# Altium footprint library XU-GENARAL PCB .PcbLib: 1176 footprints (part 53 of 75)
Each footprint in its own frame and in the unit in brackets; x right, y up, seen from the top. Pads: shape width x height; smd on the part's side, far side on the other; paste and mask are expansions set on the pad; w line width, h text height; cw(c..) or ccw(c..) is an arc to the next point about the centre after c.
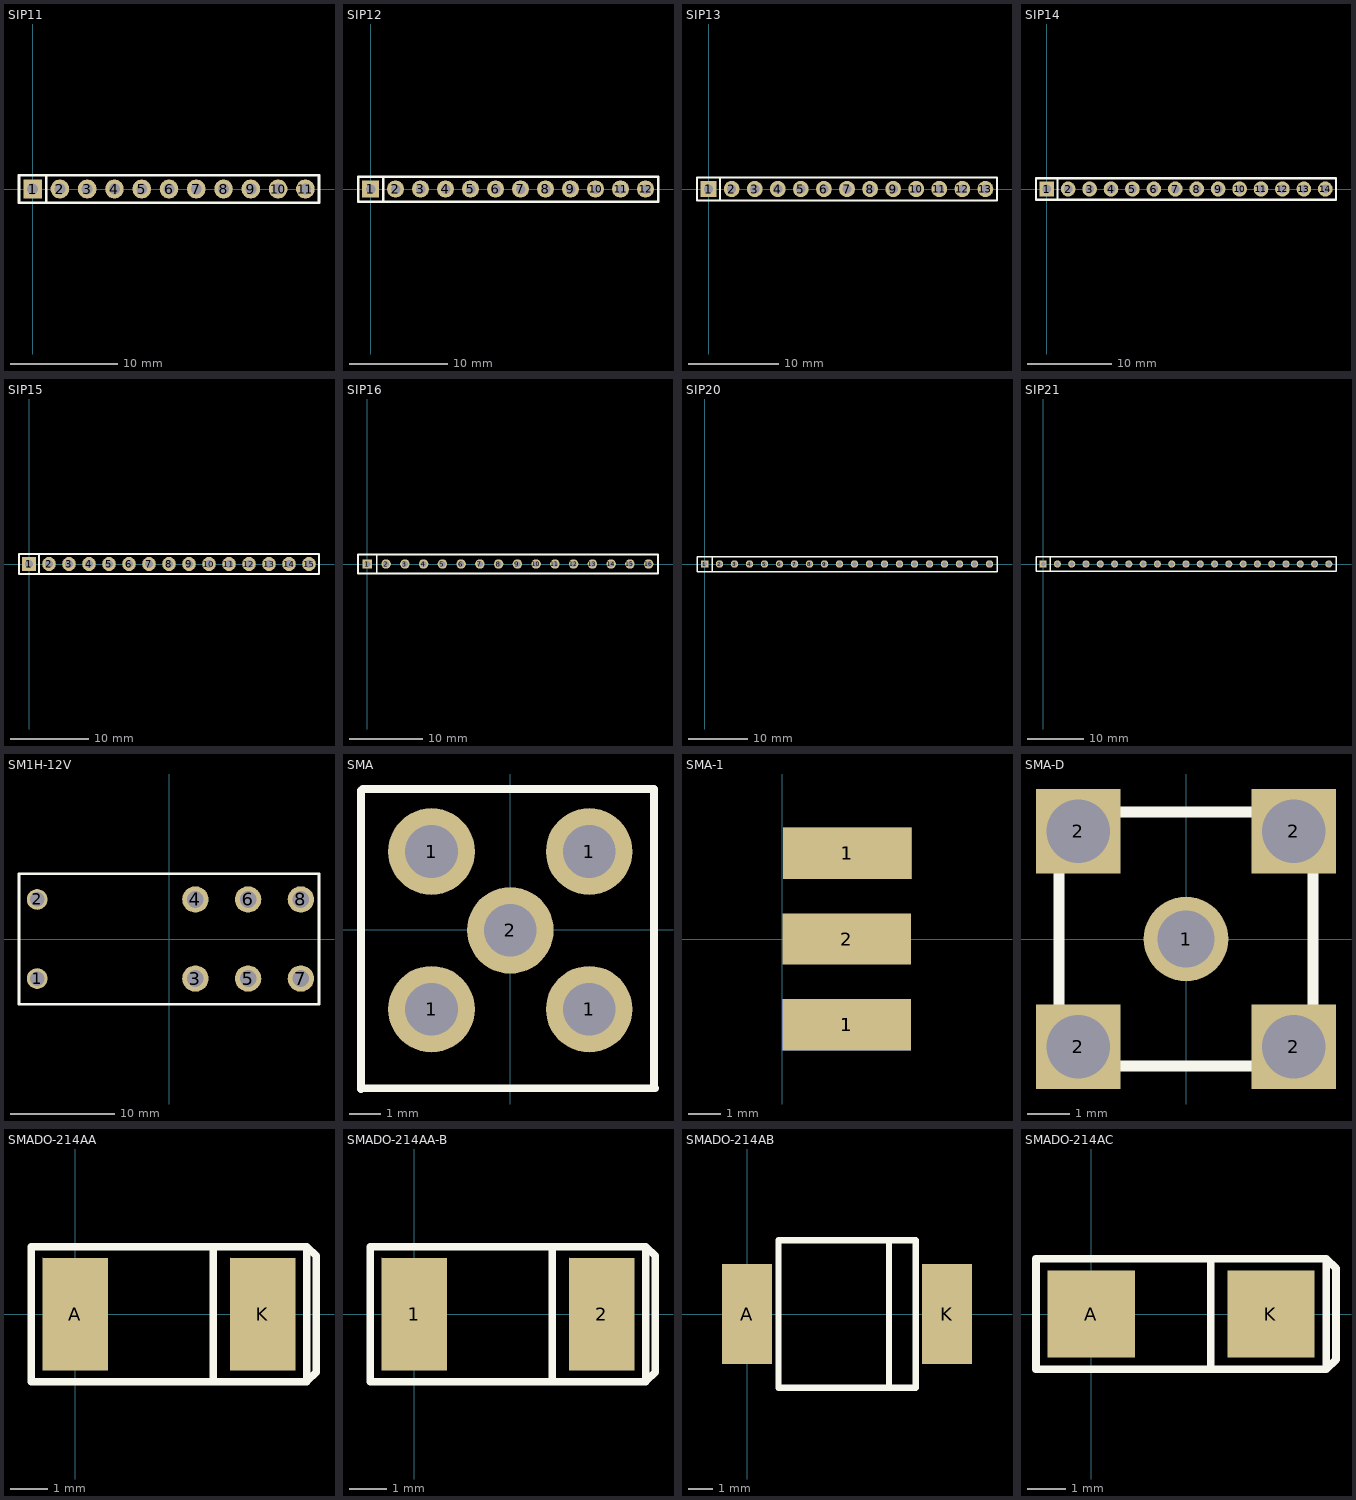
[diagram p52: the footprints below, top view; thin cyan lines are the x and y axes]

## SIP11 [mil]
pads (11):
  rect 68x70 hole 40: 1(0,0)
  oval 68x70 hole 40: 2(100,0) 3(200,0) 4(300,0) 5(400,0) 6(500,0) 7(600,0) 8(700,0) 9(800,0) 10(900,0) 11(1000,0)
Top Overlay:
  lines w10: 50,-50 50,50 ; -50,-50 1050,-50 1050,50 -50,50 -50,-50

## SIP12 [mil]
pads (12):
  rect 68x68 hole 38: 1(0,0)
  round 68 hole 38: 2(100,0) 3(200,0) 4(300,0) 5(400,0) 6(500,0) 7(600,0) 8(700,0) 9(800,0) 10(900,0) 11(1000,0) 12(1100,0)
Top Overlay:
  lines w10: 50,-50 50,50 ; -50,-50 1150,-50 1150,50 -50,50 -50,-50

## SIP13 [mil]
pads (13):
  rect 68x70 hole 40: 1(0,0)
  oval 68x70 hole 40: 2(100,0) 3(200,0) 4(300,0) 5(400,0) 6(500,0) 7(600,0) 8(700,0) 9(800,0) 10(900,0) 11(1000,0) 12(1100,0) 13(1200,0)
Top Overlay:
  lines w10: 50,-50 50,50 ; -50,-50 -50,50 1250,50 1250,-50 -50,-50

## SIP14 [mil]
pads (14):
  rect 68x70 hole 40: 1(0,0)
  oval 68x70 hole 40: 2(100,0) 3(200,0) 4(300,0) 5(400,0) 6(500,0) 7(600,0) 8(700,0) 9(800,0) 10(900,0) 11(1000,0) 12(1100,0) 13(1200,0) 14(1300,0)
Top Overlay:
  lines w10: 50,-50 50,50 ; -50,-50 1350,-50 1350,50 -50,50 -50,-50

## SIP15 [mil]
pads (15):
  rect 68x70 hole 40: 1(0,0)
  oval 68x70 hole 40: 2(100,0) 3(200,0) 4(300,0) 5(400,0) 6(500,0) 7(600,0) 8(700,0) 9(800,0) 10(900,0) 11(1000,0) 12(1100,0) 13(1200,0) 14(1300,0) 15(1400,0)
Top Overlay:
  lines w10: 50,-50 50,50 ; -50,-50 -50,50 1450,50 1450,-50 -50,-50

## SIP16 [mil]
pads (16):
  rect 50x50 hole 32: 1(0,0)
  round 50 hole 32: 2(100,0) 3(200,0) 4(300,0) 5(400,0) 6(500,0) 7(600,0) 8(700,0) 9(800,0) 10(900,0) 11(1000,0) 12(1100,0) 13(1200,0) 14(1300,0) 15(1400,0) 16(1500,0)
Top Overlay:
  lines w10: 50,-50 50,50 ; -50,-50 -50,50 1550,50 1550,-50 -50,-50

## SIP20 [mil]
pads (20):
  rect 50x50 hole 32: 1(0,0)
  round 50 hole 32: 2(100,0) 3(200,0) 4(300,0) 5(400,0) 6(500,0) 7(600,0) 8(700,0) 9(800,0) 10(900,0) 11(1000,0) 12(1100,0) 13(1200,0) 14(1300,0) 15(1400,0) 16(1500,0) 17(1600,0) 18(1700,0) 19(1800,0) 20(1900,0)
Top Overlay:
  lines w10: 50,-50 50,50 ; -50,-50 -50,50 1950,50 1950,-50 -50,-50

## SIP21 [mil]
pads (21):
  rect 50x50 hole 32: 1(0,0)
  round 50 hole 32: 2(100,0) 3(200,0) 4(300,0) 5(400,0) 6(500,0) 7(600,0) 8(700,0) 9(800,0) 10(900,0) 11(1000,0) 12(1100,0) 13(1200,0) 14(1300,0) 15(1400,0) 16(1500,0) 17(1600,0) 18(1700,0) 19(1800,0) 20(1900,0) 21(2000,0)
Top Overlay:
  lines w10: 50,-50 50,50 ; -50,-50 2050,-50 2050,50 -50,50 -50,-50

## SM1H-12V [mm]
pads (8):
  round 2 hole 1.4: 1(-12.7,-3.81) 2(-12.7,3.81)
  round 2.54 hole 1.6: 3(2.54,-3.81) 4(2.54,3.81) 5(7.62,-3.81) 6(7.62,3.81) 7(12.7,-3.81) 8(12.7,3.81)
Top Overlay:
  lines w0.254: -14.45,-6.3 -14.45,6.3 14.45,6.3 14.45,-6.3 -14.45,-6.3

## SMA [mm]
pads (5):
  round 2.8 hole 1.7: 1(-2.55,-2.575) 1(-2.55,2.525) 1(2.55,-2.575) 1(2.55,2.525) 2(0,-0.025)
Top Overlay:
  lines w0.254: 4.648,-5.105 4.648,4.547 -4.775,4.547 -4.826,4.496 -4.826,-5.156 -4.801,-5.131 4.674,-5.131

## SMA-1 [mm]
pads (5):
  rect 4x1.6 smd: 1(2.007,-2.667) 1(2.032,2.667) 2(2.007,0)
  rect 4x1.6 smd far side: 1(2.007,-2.667) 1(2.032,2.667)

## SMA-D [mm]
pads (5):
  round 2 hole 1.35: 1(0,0)
  rect 2x2 hole 1.5: 2(-2.54,-2.54) 2(-2.54,2.54) 2(2.54,-2.54) 2(2.54,2.54)
Top Overlay:
  lines w0.254: -3,-1.54 -3,1.54 ; -1.54,-3 1.54,-3 ; -1.54,3 1.54,3 ; 3,-1.54 3,1.54

## SMADO-214AA [mil]
pads (2):
  rect 70x120 smd: A(0,0) K(200,0)
Top Overlay:
  lines w8: 147,-72 147,72 ; 247,-72 257,-62 257,62 247,72 ; 247,-72 -47,-72 -47,72 247,72 ; 247,-72 247,72

## SMADO-214AA-B [mil]
pads (2):
  rect 70x120 smd: 1(0,0) 2(200,0)
Top Overlay:
  lines w8: 147,-72 147,72 ; 247,-72 247,72 ; 247,-72 -47,-72 -47,72 247,72 ; 247,-72 257,-62 257,62 247,72

## SMADO-214AB [mil]
pads (2):
  rect 80x160 smd: A(0,0) K(320,0)
Top Overlay:
  lines w10: 227,-118.11 227,118.11 ; 241,118.11 270,118.11 270,-118.11 242,-118.11 ; 244,-118.11 50.24,-118.11 50.24,118.11 244,118.11

## SMADO-214AC [mil]
pads (2):
  rect 90x90 smd: A(0,0) K(185,0)
Top Overlay:
  lines w8: 123,-57 123,57 ; 242,-57 242,57 ; 242,-57 252,-47 252,47 242,57 ; 242,-57 -57,-57 -57,57 242,57